# Altium footprint library OT Library.PcbLib: 396 footprints (part 18 of 25)
Each footprint in its own frame and in the unit in brackets; x right, y up, seen from the top. Pads: shape width x height; smd on the part's side, far side on the other; paste and mask are expansions set on the pad; w line width, h text height; cw(c..) or ccw(c..) is an arc to the next point about the centre after c.
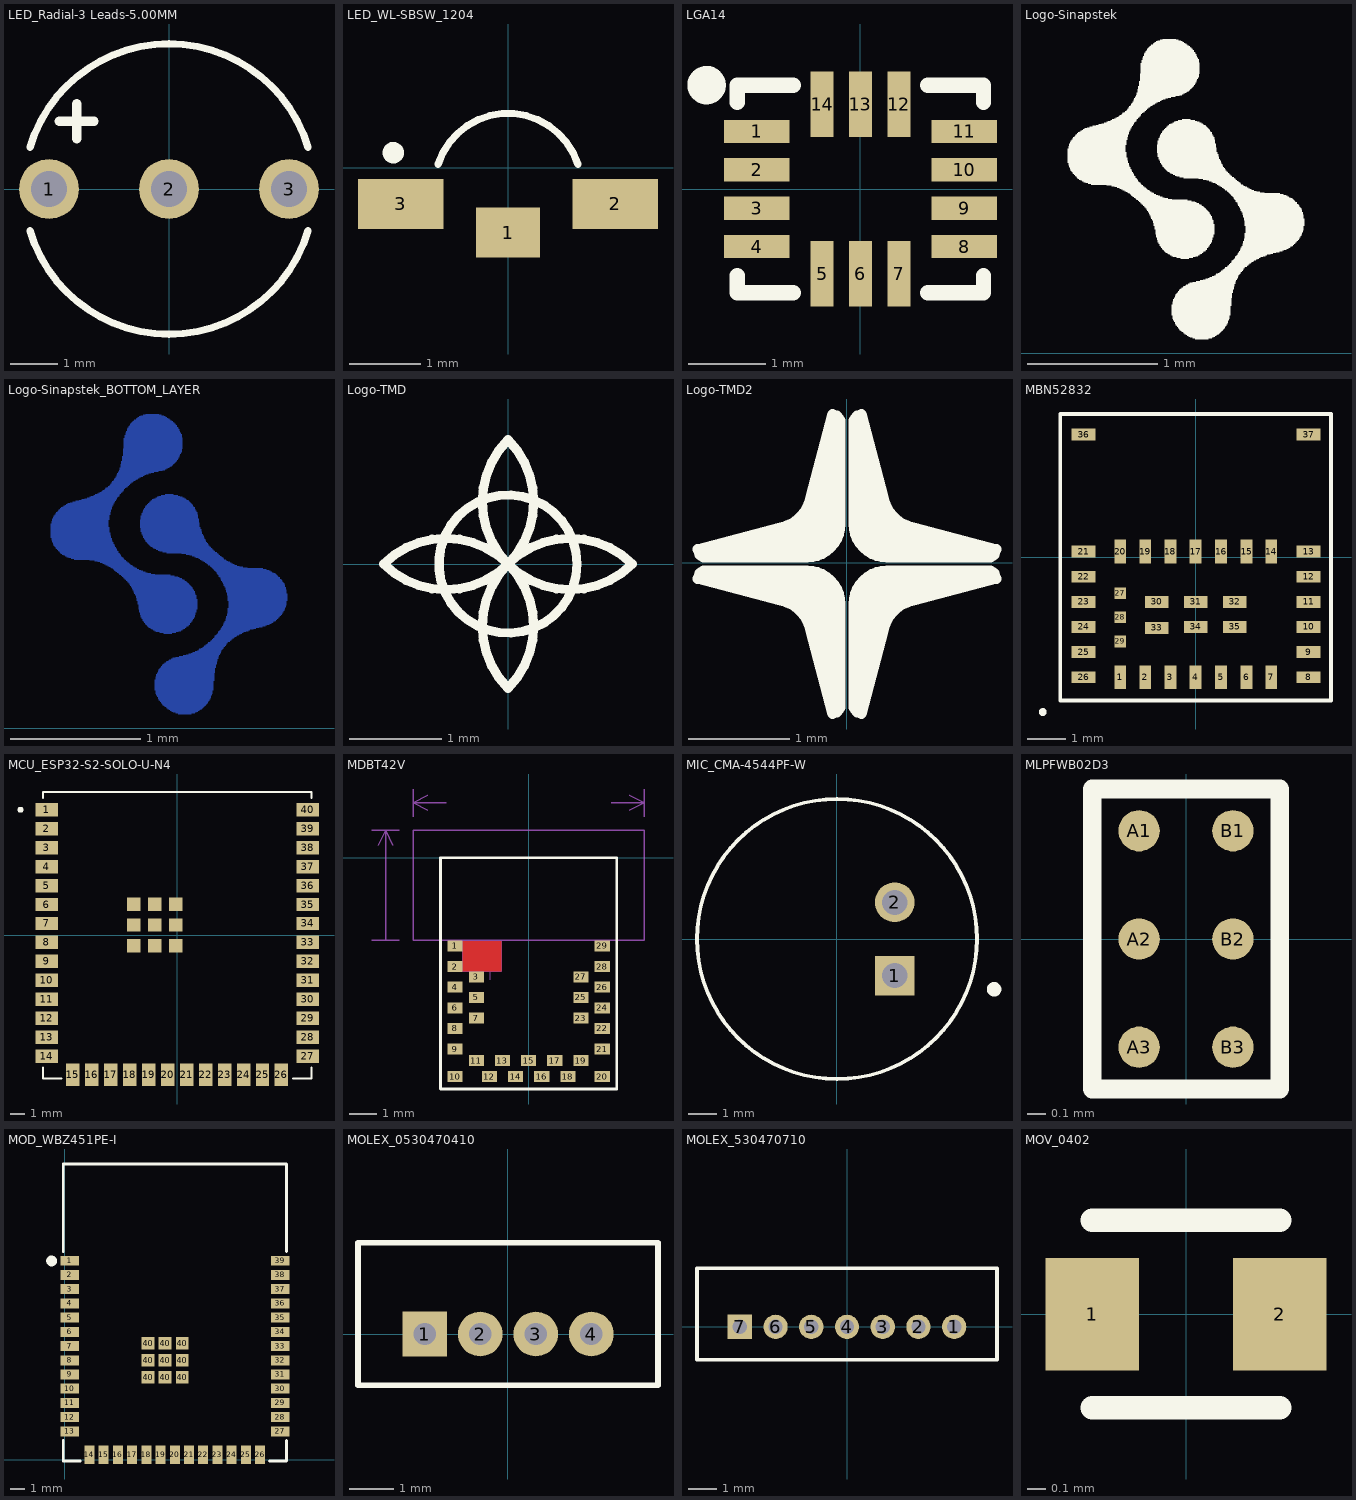
[diagram p17: the footprints below, top view; thin cyan lines are the x and y axes]

## LED_Radial-3 Leads-5.00MM [mil]
pads (3):
  round 50 / inner round 60 / far side round 50 hole 30 paste-25: 1(-100,0) 2(0,0) 3(100,0)
Top Overlay:
  lines w6: -115.95,-34.6 ccw(c0,0) 115.95,-34.6 ; -115.95,34.6 cw(c0,0) 115.95,34.6
  lines w7.87: -91.5,56.5 -62.5,56.5 ; -77,42 -77,71
3D body: height 417.32, standoff -885.83, extent -113.79,-116.04 116.13,116.03

## LED_WL-SBSW_1204 [mm] "SMD Bi-color Side view Waterclear, body 3.2x1mm"
height 1
pads (3):
  rect 0.9x0.7 smd: 1(0,-0.91)
  rect 1.2x0.7 smd: 2(1.5,-0.51) 3(-1.5,-0.51)
Top Overlay:
  circle w0.15: c-1.605,0.207 r0.075
  lines w0.1: -0.979,0.043 cw(c0,-0.27) 0.979,0.043
Top Component Outline:
  rectangle: -1.6,-0.8 -1.1,-0.27
Top 3D Body:
  rectangle: -1.6,-0.8 -1.1,-0.27
3D body: height 1.02, standoff 0.02, extent -1.6,-0.765 1.6,0.735

## LGA14 [mm] "14 Lead LGA (2.5x3x0.91) mm"
height 0.95
pads (14):
  rect 0.85x0.3 smd: 1(-1.35,0.75) 2(-1.35,0.25) 3(-1.35,-0.25) 4(-1.35,-0.75) 8(1.35,-0.75) 9(1.35,-0.25) 10(1.35,0.25) 11(1.35,0.75)
  rect 0.3x0.85 smd: 5(-0.5,-1.1) 6(0,-1.1) 7(0.5,-1.1) 12(0.5,1.1) 13(0,1.1) 14(-0.5,1.1)
Top Overlay:
  circle w0.25: c-2,1.35 r0.125
  lines w0.2: -1.6,-1.125 -1.6,-1.35 -0.875,-1.35 ; -1.6,1.125 -1.6,1.35 -0.875,1.35 ; 0.875,-1.35 1.6,-1.35 1.6,-1.125 ; 0.875,1.35 1.6,1.35 1.6,1.125
3D body: height 0.85, standoff -0.01, extent -1.5,-1.25 1.5,1.25

## Logo-Sinapstek [mm]
Top Overlay:
  drawing of 2 lines, arcs and shapes, not listed

## Logo-Sinapstek_BOTTOM_LAYER [mm]
Bottom Layer:
  drawing of 2 lines, arcs and shapes, not listed

## Logo-TMD [mm]
Top Overlay:
  circle w0.1: c0,0 r0.75
  lines w0.1: 0,0 ccw(c-0.675,0.675) 0,1.35 ccw(c0.675,0.675) 0,0 ; 0,0 cw(c-0.675,0.675) -1.35,0 cw(c-0.675,-0.675) 0,0 ; 0,0 cw(c-0.675,-0.675) 0,-1.35 cw(c0.675,-0.675) 0,0 ; 0,0 cw(c0.675,-0.675) 1.35,0 cw(c0.675,0.675) 0,0

## Logo-TMD2 [mm]
Top Overlay:
  region: -0.143,-1.5 -0.36,-0.674 -0.45,-0.478 -0.659,-0.375 -1.075,-0.266 -1.478,-0.16 -1.418,-0.079 -0.925,-0.078 -0.393,-0.079 -0.15,-0.178 -0.063,-0.409 -0.063,-1.437
  region: 0.147,-1.5 0.364,-0.674 0.454,-0.478 0.663,-0.375 1.079,-0.266 1.482,-0.16 1.422,-0.079 0.929,-0.078 0.397,-0.079 0.154,-0.178 0.067,-0.409 0.067,-1.437
  region: 0.147,1.472 0.364,0.646 0.454,0.45 0.663,0.347 1.079,0.238 1.482,0.132 1.422,0.051 0.929,0.05 0.397,0.051 0.154,0.15 0.067,0.381 0.067,1.409
  region: -0.143,1.472 -0.36,0.646 -0.45,0.45 -0.659,0.347 -1.075,0.238 -1.478,0.132 -1.418,0.051 -0.925,0.05 -0.393,0.051 -0.15,0.15 -0.063,0.381 -0.063,1.409
  lines w0.1: -1.478,-0.16 -1.457,-0.103 -1.418,-0.079 -0.393,-0.079 cw(c-0.393,-0.409) -0.063,-0.409 -0.063,-1.437 -0.099,-1.483 -0.143,-1.5 -0.36,-0.674 ccw(c-0.73,-0.745) -0.659,-0.375 -1.478,-0.16 ; -1.478,0.132 -1.457,0.075 -1.418,0.051 -0.393,0.051 ccw(c-0.393,0.381) -0.063,0.381 -0.063,1.409 -0.099,1.455 -0.143,1.472 -0.36,0.646 cw(c-0.73,0.717) -0.659,0.347 -1.478,0.132 ; 0.067,-1.437 0.103,-1.483 0.147,-1.5 0.364,-0.674 cw(c0.734,-0.745) 0.663,-0.375 1.482,-0.16 1.461,-0.103 1.422,-0.079 0.397,-0.079 ccw(c0.397,-0.409) 0.067,-0.409 0.067,-1.437 ; 0.067,0.381 ccw(c0.397,0.381) 0.397,0.051 1.422,0.051 1.461,0.075 1.482,0.132 0.663,0.347 cw(c0.734,0.717) 0.364,0.646 0.147,1.472 0.103,1.455 0.067,1.409 0.067,0.381

## MBN52832 [mil]
pads (37):
  rect 12x24 smd: 1(-76.77,-122.05) 2(-51.18,-122.05) 3(-25.59,-122.05) 4(0,-122.05) 5(26,-122.05) 6(52,-122.05) 7(77,-122.05) 14(77,6) 15(52,6) 16(26,6) 17(0,6) 18(-25.59,6) 19(-51.18,6) 20(-76.77,6)
  rect 24x12 smd: 8(115,-122.05) 9(115,-96.46) 10(115,-70.87) 11(115,-45.28) 12(115,-19.68) 13(115,6) 21(-114.09,6) 22(-114.09,-19.68) 23(-114.09,-45.28) 24(-114.09,-70.87) 25(-114.09,-96.46) 26(-114.09,-122.05) 30(-39.37,-45.28) 31(0,-45.28) 32(40,-45.28) 33(-39.37,-71.85) 34(0,-70.87) 35(40,-70.87) 36(-114.09,125) 37(115,125)
  rect 12x12 smd: 27(-76.77,-36.42) 28(-76.77,-61.02) 29(-76.77,-85.63)
Top Overlay:
  lines w4: -157.48,-157.48 cw(c-155.51,-157.48) -153.54,-157.48 cw(c-155.51,-157.48) -157.48,-157.48 ; -137.8,-145.67 -137.8,146 138,146 138,-145.67 -137.8,-145.67
3D body: height 41.34, standoff 1.97, extent -137.8,-145.67 137.79,145.67

## MCU_ESP32-S2-SOLO-U-N4 [mm]
height 3.35
pads (49):
  rect 1.5x0.9 smd: 1(-8.75,8.41) 2(-8.75,7.14) 3(-8.75,5.87) 4(-8.75,4.6) 5(-8.75,3.33) 6(-8.75,2.06) 7(-8.75,0.79) 8(-8.75,-0.48) 9(-8.75,-1.75) 10(-8.75,-3.02) 11(-8.75,-4.29) 12(-8.75,-5.56) 13(-8.75,-6.83) 14(-8.75,-8.1) 27(8.75,-8.1) 28(8.75,-6.83) 29(8.75,-5.56) 30(8.75,-4.29) 31(8.75,-3.02) 32(8.75,-1.75) 33(8.75,-0.48) 34(8.75,0.79) 35(8.75,2.06) 36(8.75,3.33) 37(8.75,4.6) 38(8.75,5.87) 39(8.75,7.14) 40(8.75,8.41)
  rect 0.9x1.5 smd: 15(-6.985,-9.35) 16(-5.715,-9.35) 17(-4.445,-9.35) 18(-3.175,-9.35) 19(-1.905,-9.35) 20(-0.635,-9.35) 21(0.635,-9.35) 22(1.905,-9.35) 23(3.175,-9.35) 24(4.445,-9.35) 25(5.715,-9.35) 26(6.985,-9.35)
  rect 0.9x0.9 smd: 41_1(-2.9,2.09) 41_2(-1.5,2.09) 41_3(-0.1,2.09) 41_4(-2.9,0.69) 41_5(-1.5,0.69) 41_6(-0.1,0.69) 41_7(-2.9,-0.71) 41_8(-1.5,-0.71) 41_9(-0.1,-0.71)
Top Overlay:
  circle w0.2: c-10.5,8.41 r0.1
  lines w0.127: -9,-8.87 -9,-9.6 -7.755,-9.6 ; -9,9.18 -9,9.6 9,9.6 9,9.18 ; 7.755,-9.6 9,-9.6 9,-8.87
3D body: height 3.35, standoff 0, extent -9,-9.6 9,9.6

## MDBT42V [mm]
pads (29):
  rect 0.55x0.4 smd mask+0: 1(-2.675,-3.2) 2(-2.675,-3.95) 3(-1.9,-4.325) 4(-2.675,-4.7) 5(-1.9,-5.075) 6(-2.675,-5.45) 7(-1.9,-5.825) 8(-2.675,-6.2) 9(-2.675,-6.95) 10(-2.675,-7.95) 11(-1.9,-7.365) 12(-1.425,-7.95) 13(-0.95,-7.365) 14(-0.475,-7.95) 15(0,-7.365) 16(0.475,-7.95) 17(0.95,-7.365) 18(1.425,-7.95) 19(1.9,-7.365) 20(2.675,-7.95) 21(2.675,-6.95) 22(2.675,-6.2) 23(1.9,-5.825) 24(2.675,-5.45) 25(1.9,-5.075) 26(2.675,-4.7) 27(1.9,-4.325) 28(2.675,-3.95) 29(2.675,-3.2)
Top Layer:
  pour cut-out: -2.4,-3.025 -2.4,-4.125 -1,-4.125 -1,-3.025
Top Overlay:
  lines w0.1: -3.2,-8.4 -3.2,0 0,0 3.2,0 3.2,-8.4 -3.2,-8.4
Top Component Outline:
  lines w0.05: -5.7,-3 -4.7,-3 ; -5.7,1 -4.7,1 ; -5.47,0.461 -5.2,1 ; -5.2,-3 -5.2,1 ; -4.93,0.461 -5.2,1 ; -4.2,1.5 -4.2,2.5 ; -3.661,1.73 -4.2,2 ; -3.661,2.27 -4.2,2 ; -3,2 -4.2,2 ; 3,2 4.2,2 ; 3.661,1.73 4.2,2 ; 3.661,2.27 4.2,2 ; 4.2,1.5 4.2,2.5 ; -4.2,-3 4.2,-3 4.2,1 -4.2,1 -4.2,-3
  text "as wide as possible" at -6.125,-3.575 h0.4
  text "No ground pad" at -2.525,-1.4 h0.4
  text "as wide as possible" at -2.7,1.875 h0.4
Mechanical 3:
  lines w0.03: -1.5,-4.013 -1.4,-3.7 ; -1.4,-4.425 -1.4,-3.7 ; -1.3,-4.013 -1.4,-3.7
  lines w0.05: -2.4,-4.125 -2.4,-3 -1,-3 -1,-4.125 -2.4,-4.125
  text "Toplayer no ground pad" at -2.15,-4.775 h0.2
3D body: height 1.6, standoff 0, extent -3.2,-8.4 3.2,0

## MIC_CMA-4544PF-W [mm]
pads (2):
  rect 1.378x1.378 / inner round 1.378 / far side rect 1.378x1.378 hole 0.87: 1(2,-1.27)
  round 1.378 hole 0.87: 2(2,1.27)
Top Overlay:
  circle w0.127: c0,0 r4.85
  circle w0.3: c5.443,-1.741 r0.1
3D body: height 4.7, standoff -4.5, extent -4.85,-4.85 4.85,4.85

## MLPFWB02D3 [mm]
pads (6):
  rrect100% 0.22x0.22 smd: A1(-0.25,0.577) A2(-0.25,0) A3(-0.25,-0.577) B1(0.25,0.577) B2(0.25,0) B3(0.25,-0.577)
Top Overlay:
  lines w0.1: -0.5,-0.8 -0.5,0.8 0.5,0.8 0.5,-0.8 -0.5,-0.8
3D body: height 0.65, standoff 0, extent -0.521,-0.826 0.521,0.826

## MOD_WBZ451PE-I [mm]
height 2.3
pads (48):
  rect 1.3x0.7 smd paste+0 mask+0: 1(0.35,13.995) 2(0.35,12.995) 3(0.35,11.995) 4(0.35,10.995) 5(0.35,9.995) 6(0.35,8.995) 7(0.35,7.995) 8(0.35,6.995) 9(0.35,5.995) 10(0.35,4.995) 11(0.35,3.995) 12(0.35,2.995) 13(0.35,1.995) 27(15.15,1.995) 28(15.15,2.995) 29(15.15,3.995) 30(15.15,4.995) 31(15.15,5.995) 32(15.15,6.995) 33(15.15,7.995) 34(15.15,8.995) 35(15.15,9.995) 36(15.15,10.995) 37(15.15,11.995) 38(15.15,12.995) 39(15.15,13.995)
  rect 0.7x1.3 smd paste+0 mask+0: 14(1.75,0.35) 15(2.75,0.35) 16(3.75,0.35) 17(4.75,0.35) 18(5.75,0.35) 19(6.75,0.35) 20(7.749,0.35) 21(8.749,0.35) 22(9.749,0.35) 23(10.749,0.35) 24(11.749,0.35) 25(12.749,0.35) 26(13.749,0.35)
  rect 0.9x0.9 smd paste+0 mask+0: 40(5.867,5.795) 40(5.867,6.995) 40(5.867,8.195) 40(7.067,6.995) 40(7.067,5.795) 40(7.067,8.195) 40(8.267,8.195) 40(8.267,5.795) 40(8.267,6.995)
Top Overlay:
  circle w0.356: c-0.916,13.981 r0.2
  lines w0.2: -0.1,1.345 -0.1,-0.1 1.1,-0.1 ; -0.1,14.645 -0.1,20.8 15.599,20.8 15.599,14.645 ; 14.399,-0.1 15.599,-0.1 15.599,1.345
3D body: height 3, standoff 0.1, extent 0,0 15.5,20.7

## MOLEX_0530470410 [mm]
pads (4):
  rect 1.008x1.008 hole 0.5: 1(-1.875,0)
  round 1.008 hole 0.5: 2(-0.625,0) 3(0.625,0) 4(1.875,0)
Top Overlay:
  lines w0.127: -3.375,-1.15 3.375,-1.15 3.375,2.05 -3.375,2.05 -3.375,-1.15
3D body: height 4.07, standoff -2.43, extent -3.372,-1.143 3.378,2.057

## MOLEX_530470710 [mm]
height 4.2
pads (7):
  round 0.85 hole 0.5 mask+0.076: 1(3.75,0) 2(2.5,0) 3(1.25,0) 4(0,0) 5(-1.25,0) 6(-2.5,0)
  rect 0.85x0.85 hole 0.5 mask+0.076: 7(-3.75,0)
Top Overlay:
  lines w0.127: -5.25,-1.15 5.25,-1.15 5.25,2.05 -5.25,2.05 -5.25,-1.15
3D body: height 4.18, standoff -2.32, extent -5.249,-1.143 5.251,2.057

## MOV_0402 [mm] "SMD Varistor, 2-Leads, body 0.96x0.50mm"
height 0.55
pads (2):
  rect 0.5x0.6 smd: 1(-0.5,0) 2(0.5,0)
Top Overlay:
  lines w0.127: -0.5,-0.5 0.5,-0.5 ; -0.5,0.5 0.5,0.5
3D body: height 0.48, standoff 0, extent -0.48,-0.25 0.48,0.25